# Altium footprint library Connectors - USB DVI HDMI.PcbLib: 20 footprints (part 2 of 2)
Each footprint in its own frame and in the unit in brackets; x right, y up, seen from the top. Pads: shape width x height; smd on the part's side, far side on the other; paste and mask are expansions set on the pad; w line width, h text height; cw(c..) or ccw(c..) is an arc to the next point about the centre after c.
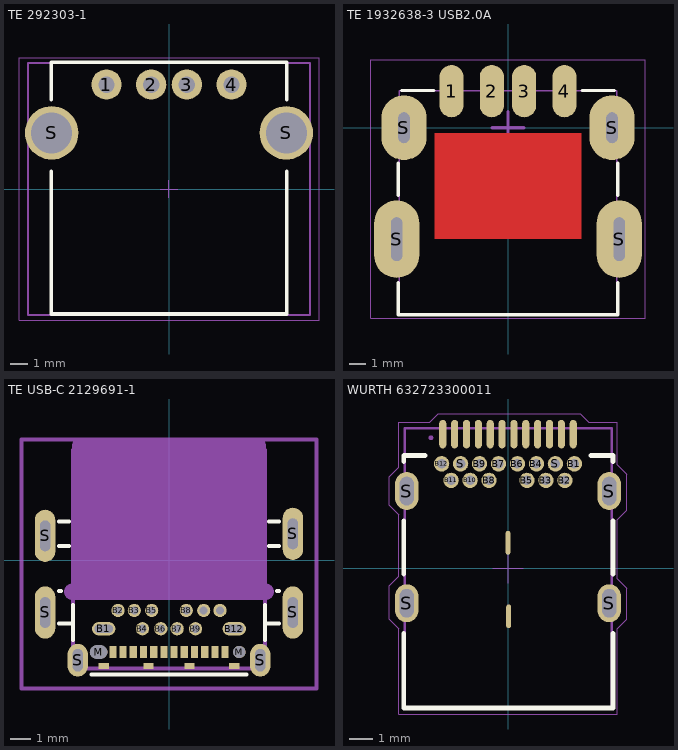
[diagram p1: the footprints below, top view; thin cyan lines are the x and y axes]

## TE 292303-1 [mm] "USB2.0 TYPEA 4 Pin Pitch 2-2.5mm"
height 7.1
pads (6):
  round 1.7 hole 0.92: 1(-3.5,5.85) 2(-1,5.85) 3(1,5.85) 4(3.5,5.85)
  round 3 hole 2.3: S(-6.57,3.14) S(6.57,3.14)
Top Overlay:
  lines w0.2: -6.6,1 -6.6,-7 6.6,-7 6.6,1 ; -6.6,5 -6.6,7.1 6.6,7.1 6.6,5
Mechanical 13:
  lines w0.1: -7.9,-7.05 -7.9,7.05 7.9,7.05 7.9,-7.05 -7.9,-7.05
Mechanical 15:
  lines w0.05: -0.5,0 0.5,0 ; 0,-0.5 0,0.5 ; -8.4,-7.35 -8.4,7.35 8.4,7.35 8.4,-7.35 -8.4,-7.35
3D body "TE - 292303-1.step": height 7.76, standoff -3.61, extent -8.117,-7 8.117,7

## TE 1932638-3 USB2.0A [mm] "USB 2.0 Type A RCP 4 POS Solder RA SMD 4 Terminal 1 Port T/R"
height 7.1
pads (8):
  oval 1.5x3.25 smd: 1(-3.5,2.27) 2(-1,2.27) 3(1,2.27) 4(3.5,2.27)
  oval 2.8x4.8 hole 0.7 slot 2.7 at 90 deg: S(-6.9,-6.91) S(6.9,-6.91)
  oval 2.8x4 hole 0.7 slot 1.9 at 90 deg: S(-6.45,0) S(6.45,0)
Top Layer:
  pour cut-out: -4.55,-0.35 -4.55,-6.9 4.55,-6.9 4.55,-0.35
Top Overlay:
  lines w0.2: -6.8,-9.6 -6.8,-11.6 6.8,-11.6 6.8,-9.6 ; -6.8,-4.2 -6.8,-2.2 ; -6.6,2.3 -4.6,2.3 ; 4.6,2.3 6.6,2.3 ; 6.8,-4.2 6.8,-2.2
Mechanical 13:
  lines w0.1: -6.75,-11.6 -6.75,2.3 6.75,2.3 6.75,-11.6 -6.75,-11.6
Mechanical 15:
  lines w0.05: -8.5,-11.8 8.5,-11.8 8.5,4.2 -8.5,4.2 -8.5,-11.8
  lines w0.2: -1,0 1,0 ; 0,-1 0,1
3D body "TE - 1932638-3.step": height 7.64, standoff -1.22, extent -7.315,-11.6 7.315,3.34

## TE USB-C 2129691-1 [mm]
height 2.27
pads (36):
  rect 0.35x0.6 smd: A1(2.75,-4.5) A2(2.25,-4.5) A3(1.75,-4.5) A4(1.25,-4.5) A5(0.75,-4.5) A6(0.25,-4.5) A7(-0.25,-4.5) A8(-0.75,-4.5) A9(-1.25,-4.5) A10(-1.75,-4.5) A11(-2.25,-4.5) A12(-2.75,-4.5)
  oval 1.15x0.65 hole 0.4 slot 0.9 at 0 deg: B1(-3.2,-3.36) B12(3.2,-3.36)
  round 0.65 hole 0.4: B2(-2.5,-2.46) B3(-1.7,-2.46) B4(-1.3,-3.36) B5(-0.85,-2.46) B6(-0.4,-3.36) B7(0.4,-3.36) B8(0.85,-2.46) B9(1.3,-3.36) B10(1.7,-2.46) B11(2.5,-2.46)
  oval 0.85x0.65 hole 0.65 slot 0.85 at 0 deg unplated mask+0.102: M(-3.45,-4.5)
  round 0.6 hole 0.6 unplated mask+0.102: M(3.45,-4.5)
  oval 1x2.56 hole 0.5 slot 1.5 at 90 deg: S(-6.075,-2.56) S(-6.075,1.2) S(6.075,-2.56) S(6.075,1.3)
  oval 1x1.6 hole 0.5 slot 1.1 at 90 deg: S(-4.475,-4.9) S(4.475,-4.9)
  rect 0.5x0.3 smd: S(-3.2,-5.19) S(-1,-5.19) S(1,-5.19) S(3.2,-5.19)
Top Overlay:
  lines w0.2: -5.4,-3.1 -4.7,-3.1 ; -5.4,-1.5 -5.3,-1.5 ; -5.4,0.7 -4.9,0.7 ; -5.4,1.9 -4.9,1.9 ; -4.7,-3.9 -4.7,-2.2 ; -3.8,-5.6 0,-5.6 3.8,-5.6 ; 4.7,-3.9 4.7,-2.2 ; 4.7,-3.1 5.4,-3.1 ; 4.9,0.7 5.4,0.7 ; 4.9,1.9 5.4,1.9 ; 5.3,-1.5 5.4,-1.5
Mechanical 1:
  lines w0.2: -4.7,-5.3 0,-5.3 4.7,-5.3 4.7,5.4 0,5.4 -4.7,5.4 -4.7,-5.3
Mechanical 15:
  lines w0.2: -0.635,0 0.635,0 ; 0,-0.635 0,0.635 ; -7.239,-6.278 0,-6.278 7.239,-6.278 7.239,5.914 0,5.914 -7.239,5.914 -7.239,-6.278
Mechanical 31:
  region: 4.35,5.61 -4.35,5.61 -4.35,-1.54 4.35,-1.54
  lines w0.8: -4.75,-1.54 4.75,-1.54 ; -4.35,-1.54 -4.35,5.61 0,5.61 4.35,5.61 4.35,-1.54
3D body "TE USB 2129691-1.STEP": height 2.27, standoff -1.07, extent -6.175,-5.3 6.175,5.4

## WURTH 632723300011 [mm]
height 2.96
pads (32):
  oval 0.3x1.2 smd: A1(-2.75,5.65) A2(-2.25,5.65) A3(-1.75,5.65) A4(-1.25,5.65) A5(-0.75,5.65) A6(-0.25,5.65) A7(0.25,5.65) A8(0.75,5.65) A9(1.25,5.65) A10(1.75,5.65) A11(2.25,5.65) A12(2.75,5.65)
  round 0.65 hole 0.4: B1(2.8,4.4) B2(2.4,3.7) B3(1.6,3.7) B4(1.2,4.4) B5(0.8,3.7) B6(0.4,4.4) B7(-0.4,4.4) B8(-0.8,3.7) B9(-1.2,4.4) B10(-1.6,3.7) B11(-2.4,3.7) B12(-2.8,4.4) S(-2,4.4) S(2,4.4)
  oval 1x1.6 hole 1.2 slot 0.6 at 0 deg: S(-4.27,-1.48) S(-4.27,3.25) S(4.27,-1.48) S(4.27,3.25)
  oval 0.2x1 smd: S(0,1.07) S(0.025,-2.03)
Top Overlay:
  lines w0.2: -4.4,-2.75 -4.4,-5.9 4.425,-5.9 4.425,-2.75 ; -4.4,-0.25 -4.4,2 ; -4.4,4.5 -4.4,4.75 -3.5,4.75 ; 3.5,4.75 4.425,4.75 4.425,4.5 ; 4.425,-0.25 4.425,2
Mechanical 13:
  circle w0.1: c-3.25,5.5 r0.05
  lines w0.1: -4.35,-5.9 4.375,-5.9 4.375,5.9 -4.35,5.9 -4.35,-5.9
Mechanical 15:
  lines w0.05: -0.635,0 0.635,0 ; 0,-0.635 0,0.635 ; -5,-2.15 -4.6,-2.55 -4.6,-6.15 4.6,-6.15 4.6,-2.55 5,-2.15 5,-0.85 4.6,-0.45 4.6,2.05 5,2.45 5,3.95 4.6,4.35 4.6,6.15 3.4,6.15 3.05,6.5 -2.95,6.5 -3.3,6.15 -4.6,6.15 -4.6,4.25 -5,3.85 -5,2.65 -4.6,2.25 -4.6,-0.35 -5,-0.75 -5,-2.15
3D body "Wurth - WR-COM 632723300011.step": height 3.06, standoff -1.8, extent -4.37,-5.894 4.37,5.9